# Altium footprint library Footprint.PcbLib: 387 footprints (part 25 of 25)
Each footprint in its own frame and in the unit in brackets; x right, y up, seen from the top. Pads: shape width x height; smd on the part's side, far side on the other; paste and mask are expansions set on the pad; w line width, h text height; cw(c..) or ccw(c..) is an arc to the next point about the centre after c.
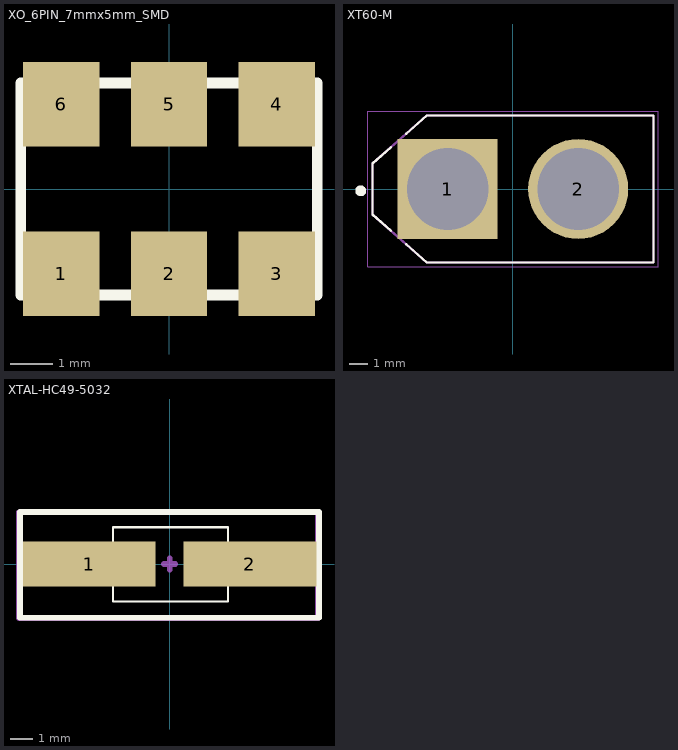
[diagram p24: the footprints below, top view; thin cyan lines are the x and y axes]

## XO_6PIN_7mmx5mm_SMD [mm]
pads (6):
  rect 1.8x2 smd: 1(-2.54,-2) 2(0,-2) 3(2.54,-2) 4(2.54,2) 5(0,2) 6(-2.54,2)
Top Overlay:
  lines w0.254: -3.5,-2.5 -3.5,2.5 3.5,2.5 3.5,-2.5 -3.5,-2.5

## XT60-M [mm]
pads (2):
  rect 5.516x5.516 hole 4.5: 1(-3.6,0)
  round 5.516 hole 4.5: 2(3.6,0)
Top Overlay:
  circle w0.3: c-8.4,-0.1 r0.15
  lines w0.127: -6.73,-2.3 -7.75,-1.4 -7.75,1.4 -6.73,2.3 ; -5.88,-3.05 -4.75,-4.05 7.75,-4.05 7.75,4.05 -4.75,4.05 -5.88,3.05
Mechanical 13:
  lines w0.127: -7.75,-1.4 -4.75,-4.05 7.75,-4.05 7.75,4.05 -4.75,4.05 -7.75,1.4 -7.75,-1.4
Mechanical 15:
  lines w0.05: -8,-4.3 8,-4.3 8,4.3 -8,4.3 -8,-4.3
3D body "XT60-M--3DModel-STEP-56544.STEP": height 16, standoff -4.5, extent -7.75,-4.064 7.75,4.036

## XTAL-HC49-5032 [mm]
pads (2):
  rect 5.9x2 smd: 1(-3.575,0) 2(3.575,0)
Top Overlay:
  lines w0.1: -2.523,-1.663 -2.523,1.637 2.602,1.637 2.602,-1.663 -2.523,-1.663
  lines w0.254: -6.655,-2.39 -6.655,2.31 6.645,2.31 6.645,-2.39 -6.655,-2.39
Mechanical 15:
  lines w0.254: -0.254,0 0.254,0 ; 0,-0.254 0,0.254 ; -6.7,-2.4 6.6,-2.4 6.6,2.3 -6.7,2.3 -6.7,-2.4
  text ".Designator" at -2.5,2.7 h1.52